# Altium footprint library Airscout_PCB_LibV2.0.PcbLib: 50 footprints (part 4 of 4)
Each footprint in its own frame and in the unit in brackets; x right, y up, seen from the top. Pads: shape width x height; smd on the part's side, far side on the other; paste and mask are expansions set on the pad; w line width, h text height; cw(c..) or ccw(c..) is an arc to the next point about the centre after c.
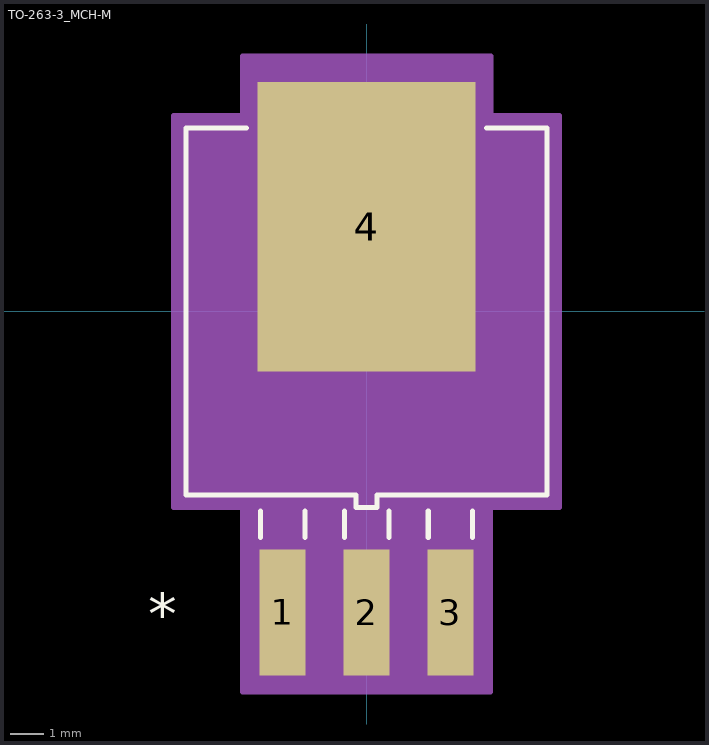
[diagram p3: the footprints below, top view; thin cyan lines are the x and y axes]

## TO-263-3_MCH-M [mil]
pads (4):
  rect 55x150 smd paste+0 mask+0: 1(-100,-358.5) 2(0,-358.5) 3(100,-358.5)
  rect 260x345 smd paste+0 mask+0: 4(0,101)
Top Overlay:
  lines w6: -143.1,218.5 -215,218.5 -215,-218.5 -12.5,-218.5 -12.5,-233.5 12.5,-233.5 12.5,-218.5 215,-218.5 215,218.5 143.1,218.5 ; -126.5,-269.5 -126.5,-237.5 ; -73.5,-269.5 -73.5,-237.5 ; -26.5,-269.5 -26.5,-237.5 ; 26.5,-269.5 26.5,-237.5 ; 73.5,-269.5 73.5,-237.5 ; 126.5,-269.5 126.5,-237.5
  text "*" at -259.84,-385.83 h50
Mechanical 13:
  lines w1: -210,-213.5 -210,213.5 210,213.5 210,-213.5 -210,-213.5 ; -126.5,-411.5 -73.5,-411.5 -73.5,-213.5 -126.5,-213.5 -126.5,-411.5 ; -26.5,-411.5 26.5,-411.5 26.5,-213.5 -26.5,-213.5 -26.5,-411.5 ; -7.5,-228.5 7.5,-228.5 7.5,-213.5 -7.5,-213.5 -7.5,-228.5 ; 73.5,-411.5 126.5,-411.5 126.5,-213.5 73.5,-213.5 73.5,-411.5
  text "*" at -259.84,-385.83 h50
Mechanical 15:
  region: -230,-233.5 -230,233.5 -148,233.5 -148,304.5 148,304.5 148,233.5 230,233.5 230,-233.5 147.5,-233.5 147.5,-453.5 -147.5,-453.5 -147.5,-233.5
  lines w6: -230,-233.5 -147.5,-233.5 -147.5,-453.5 147.5,-453.5 147.5,-233.5 230,-233.5 230,233.5 148,233.5 148,304.5 -148,304.5 -148,233.5 -230,233.5 -230,-233.5
3D body "TO-263-3_MCH.step": height 181.1, standoff -2.01, extent -210,-411.5 210,253.5

## TP4056 USB_C Charging Module [mm]